# Altium footprint library IC_SMD_QUAD.PCBLIB: 78 footprints (part 4 of 5)
Each footprint in its own frame and in the unit in brackets; x right, y up, seen from the top. Pads: shape width x height; smd on the part's side, far side on the other; paste and mask are expansions set on the pad; w line width, h text height; cw(c..) or ccw(c..) is an arc to the next point about the centre after c.
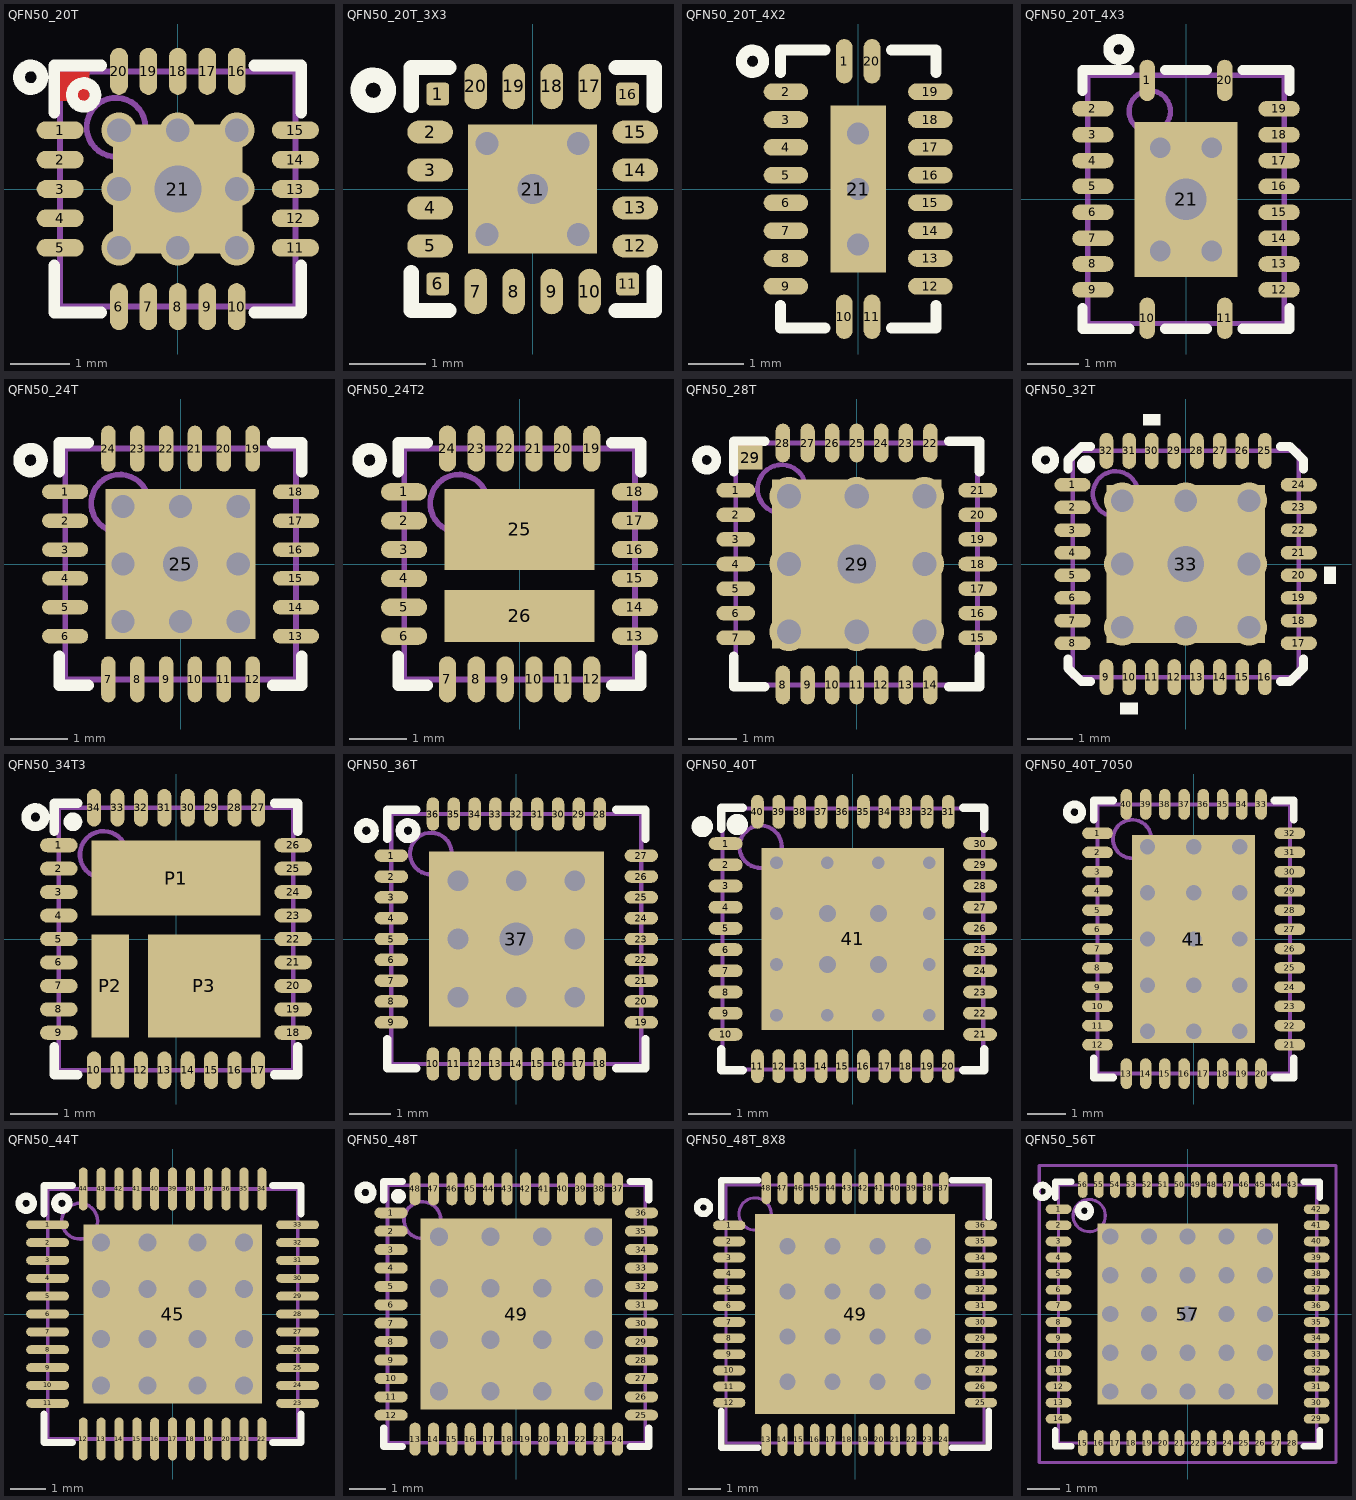
[diagram p3: the footprints below, top view; thin cyan lines are the x and y axes]

## QFN50_20T [mm] "QFN, 20, 4X4mm, 0.5mm"
height 1
pads (21):
  oval 0.8x0.3 smd mask+0.05: 1(-2,1) 2(-2,0.5) 3(-2,0) 4(-2,-0.5) 5(-2,-1) 11(2,-1) 12(2,-0.5) 13(2,0) 14(2,0.5) 15(2,1)
  oval 0.3x0.8 smd mask+0.05: 6(-1,-2) 7(-0.5,-2) 8(0,-2) 9(0.5,-2) 10(1,-2) 16(1,2) 17(0.5,2) 18(0,2) 19(-0.5,2) 20(-1,2)
  rect 2.2x2.2 smd mask+0.1: 21(0,0)
via 0,0 diameter 1.2 hole 0.8
via -1,1 diameter 0.6 hole 0.4
via -1,-1 diameter 0.6 hole 0.4
via 1,-1 diameter 0.6 hole 0.4
via 1,1 diameter 0.6 hole 0.4
via 0,1 diameter 0.6 hole 0.4
via 0,-1 diameter 0.6 hole 0.4
via 1,0 diameter 0.6 hole 0.4
via -1,0 diameter 0.6 hole 0.4
TopLayer:
  rectangle: -2,1.5 -1.5,2
TopOverlay:
  circle w0.2: c-2.5,1.9 r0.2
  circle w0.2: c-1.6,1.6 r0.2
  lines w0.2: -2.1,-1.3 -2.1,-2.1 -1.3,-2.1 ; -2.1,1.3 -2.1,2.1 -1.3,2.1 ; 1.3,-2.1 2.1,-2.1 2.1,-1.3 ; 1.3,2.1 2.1,2.1 2.1,1.3
Mechanical13:
  circle w0.1: c-1.05,1.05 r0.5
  lines w0.1: -2,-2 2,-2 2,2 -2,2 -2,-2
3D body: height 1, standoff 0, extent -2,-2 2,2

## QFN50_20T_3X3 [mm] "QFN20, pitch: 0.5mm, 3x3mm"
height 0.6
pads (21):
  rrect30% 0.3x0.3 smd mask+0.05: 1(-1.25,1.25) 6(-1.25,-1.25) 11(1.25,-1.25) 16(1.25,1.25)
  oval 0.6x0.3 smd mask+0.05: 2(-1.35,0.75) 3(-1.35,0.25) 4(-1.35,-0.25) 5(-1.35,-0.75) 12(1.35,-0.75) 13(1.35,-0.25) 14(1.35,0.25) 15(1.35,0.75)
  oval 0.3x0.6 smd mask+0.05: 7(-0.75,-1.35) 8(-0.25,-1.35) 9(0.25,-1.35) 10(0.75,-1.35) 17(0.75,1.35) 18(0.25,1.35) 19(-0.25,1.35) 20(-0.75,1.35)
  rect 1.7x1.7 smd mask+0.05: 21(0,0)
via -0.6,-0.6 diameter 0.5 hole 0.3
via 0.6,-0.6 diameter 0.5 hole 0.3
via 0.6,0.6 diameter 0.5 hole 0.3
via -0.6,0.6 diameter 0.5 hole 0.3
via 0,0 diameter 0.6 hole 0.4
TopOverlay:
  circle w0.2: c-2.1,1.3 r0.2
  lines w0.2: -1.6,-1.1 -1.6,-1.6 -1.1,-1.6 ; -1.6,1.1 -1.6,1.6 -1.1,1.6 ; 1.1,-1.6 1.6,-1.6 1.6,-1.1 ; 1.1,1.6 1.6,1.6 1.6,1.1
3D body "SW3dPS-QFN-20.STEP": height 0.62, standoff -0.08, extent -1.5,-1.5 1.5,1.5

## QFN50_20T_4X2 [mm] "RGY VQFN-20, 0.5mm Pitch, 4.5x2.5x1mm"
height 1
pads (21):
  oval 0.3x0.8 smd mask+0.075: 1(-0.25,2.3) 10(-0.25,-2.3) 11(0.25,-2.3) 20(0.25,2.3)
  oval 0.8x0.3 smd mask+0.075: 2(-1.3,1.75) 3(-1.3,1.25) 4(-1.3,0.75) 5(-1.3,0.25) 6(-1.3,-0.25) 7(-1.3,-0.75) 8(-1.3,-1.25) 9(-1.3,-1.75) 12(1.3,-1.75) 13(1.3,-1.25) 14(1.3,-0.75) 15(1.3,-0.25) 16(1.3,0.25) 17(1.3,0.75) 18(1.3,1.25) 19(1.3,1.75)
  rect 1x3 smd mask+0.1: 21(0,0)
via 0,1 diameter 0.6 hole 0.4
via 0,0 diameter 0.6 hole 0.4
via 0,-1 diameter 0.6 hole 0.4
TopOverlay:
  circle w0.2: c-1.9,2.3 r0.2
  lines w0.2: -1.4,-2.1 -1.4,-2.5 -0.6,-2.5 ; -1.4,2.1 -1.4,2.5 -0.6,2.5 ; 0.6,-2.5 1.4,-2.5 1.4,-2.1 ; 0.6,2.5 1.4,2.5 1.4,2.1
3D body: height 1, standoff 0, extent -1.3,-2.4 1.3,2.4

## QFN50_20T_4X3 [mm] "RGY VQFN-20, 0.5mm Pitch, 4.5x3.5x1mm"
height 1
pads (21):
  oval 0.3x0.8 smd mask+0.05: 1(-0.75,2.3) 10(-0.75,-2.3) 11(0.75,-2.3) 20(0.75,2.3)
  oval 0.8x0.3 smd mask+0.05: 2(-1.8,1.75) 3(-1.8,1.25) 4(-1.8,0.75) 5(-1.8,0.25) 6(-1.8,-0.25) 7(-1.8,-0.75) 8(-1.8,-1.25) 9(-1.8,-1.75) 12(1.8,-1.75) 13(1.8,-1.25) 14(1.8,-0.75) 15(1.8,-0.25) 16(1.8,0.25) 17(1.8,0.75) 18(1.8,1.25) 19(1.8,1.75)
  rect 2x3 smd mask+0.1: 21(0,0)
via 0.5,1 diameter 0.6 hole 0.4
via 0.5,-1 diameter 0.6 hole 0.4
via -0.5,-1 diameter 0.6 hole 0.4
via -0.5,1 diameter 0.6 hole 0.4
via 0,0 diameter 1.2 hole 0.8
TopOverlay:
  circle w0.2: c-1.3,2.9 r0.2
  lines w0.2: -2,-2.1 -2,-2.5 -1.1,-2.5 ; -2,2.1 -2,2.5 -1.1,2.5 ; -0.4,-2.5 0.4,-2.5 ; -0.4,2.5 0.4,2.5 ; 1.1,-2.5 2,-2.5 2,-2.1 ; 1.1,2.5 2,2.5 2,2.1
Mechanical13:
  circle w0.1: c-0.7,1.7 r0.4
  lines w0.1: -1.9,-2.4 1.9,-2.4 1.9,2.4 -1.9,2.4 -1.9,-2.4
3D body: height 1, standoff 0, extent -1.9,-2.4 1.9,2.4

## QFN50_24T [mm] "RTW, RGE S-PQFP-N24 (TI), HVQFN24, 4X4mm, 0.5mm, MO-220 (JEDEC)"
height 1
pads (25):
  oval 0.8x0.25 smd mask+0.05: 1(-2,1.25) 2(-2,0.75) 3(-2,0.25) 4(-2,-0.25) 5(-2,-0.75) 6(-2,-1.25) 13(2,-1.25) 14(2,-0.75) 15(2,-0.25) 16(2,0.25) 17(2,0.75) 18(2,1.25)
  oval 0.25x0.8 smd mask+0.05: 7(-1.25,-2) 8(-0.75,-2) 9(-0.25,-2) 10(0.25,-2) 11(0.75,-2) 12(1.25,-2) 19(1.25,2) 20(0.75,2) 21(0.25,2) 22(-0.25,2) 23(-0.75,2) 24(-1.25,2)
  rect 2.6x2.6 smd paste-1.2 mask+0.05: 25(0,0)
via 0,0 diameter 0.8 hole 0.6
via -1,1 diameter 0.6 hole 0.4
via -1,-1 diameter 0.6 hole 0.4
via 1,-1 diameter 0.6 hole 0.4
via 1,1 diameter 0.6 hole 0.4
via 0,1 diameter 0.6 hole 0.4
via 0,-1 diameter 0.6 hole 0.4
via 1,0 diameter 0.6 hole 0.4
via -1,0 diameter 0.6 hole 0.4
TopOverlay:
  circle w0.2: c-2.6,1.8 r0.2
  lines w0.2: -2.1,-1.6 -2.1,-2.1 -1.6,-2.1 ; -2.1,1.6 -2.1,2.1 -1.6,2.1 ; 1.6,-2.1 2.1,-2.1 2.1,-1.6 ; 1.6,2.1 2.1,2.1 2.1,1.6
TopPaste:
  region: 0.101,-1.141 0.1,-1.131 0.1,-0.149 0.101,-0.139 0.104,-0.13 0.108,-0.122 0.114,-0.114 0.122,-0.108 0.13,-0.104 0.139,-0.101 0.149,-0.1 1.131,-0.1 1.141,-0.101 1.15,-0.104 1.158,-0.108 1.166,-0.114 1.172,-0.122 1.176,-0.13 1.179,-0.139 1.18,-0.149 1.18,-1.131 1.179,-1.141 1.176,-1.15 1.172,-1.158 1.166,-1.166 1.158,-1.172 1.15,-1.176 1.141,-1.179 1.131,-1.18 0.149,-1.18 0.139,-1.179 0.13,-1.176 0.122,-1.172 0.114,-1.166 0.108,-1.158 0.104,-1.15
  region: -0.101,-0.139 -0.1,-0.149 -0.1,-1.131 -0.101,-1.141 -0.104,-1.15 -0.108,-1.158 -0.114,-1.166 -0.122,-1.172 -0.13,-1.176 -0.139,-1.179 -0.149,-1.18 -1.131,-1.18 -1.141,-1.179 -1.15,-1.176 -1.158,-1.172 -1.166,-1.166 -1.172,-1.158 -1.176,-1.15 -1.179,-1.141 -1.18,-1.131 -1.18,-0.149 -1.179,-0.139 -1.176,-0.13 -1.172,-0.122 -1.166,-0.114 -1.158,-0.108 -1.15,-0.104 -1.141,-0.101 -1.131,-0.1 -0.149,-0.1 -0.139,-0.101 -0.13,-0.104 -0.122,-0.108 -0.114,-0.114 -0.108,-0.122 -0.104,-0.13
  region: -0.101,1.141 -0.1,1.131 -0.1,0.149 -0.101,0.139 -0.104,0.13 -0.108,0.122 -0.114,0.114 -0.122,0.108 -0.13,0.104 -0.139,0.101 -0.149,0.1 -1.131,0.1 -1.141,0.101 -1.15,0.104 -1.158,0.108 -1.166,0.114 -1.172,0.122 -1.176,0.13 -1.179,0.139 -1.18,0.149 -1.18,1.131 -1.179,1.141 -1.176,1.15 -1.172,1.158 -1.166,1.166 -1.158,1.172 -1.15,1.176 -1.141,1.179 -1.131,1.18 -0.149,1.18 -0.139,1.179 -0.13,1.176 -0.122,1.172 -0.114,1.166 -0.108,1.158 -0.104,1.15
  region: 0.101,0.139 0.1,0.149 0.1,1.131 0.101,1.141 0.104,1.15 0.108,1.158 0.114,1.166 0.122,1.172 0.13,1.176 0.139,1.179 0.149,1.18 1.131,1.18 1.141,1.179 1.15,1.176 1.158,1.172 1.166,1.166 1.172,1.158 1.176,1.15 1.179,1.141 1.18,1.131 1.18,0.149 1.179,0.139 1.176,0.13 1.172,0.122 1.166,0.114 1.158,0.108 1.15,0.104 1.141,0.101 1.131,0.1 0.149,0.1 0.139,0.101 0.13,0.104 0.122,0.108 0.114,0.114 0.108,0.122 0.104,0.13
Mechanical13:
  circle w0.1: c-1.05,1.05 r0.5
  lines w0.1: -2,-2 -2,2 2,2 2,-2 -2,-2
3D body "RTW0024H.stp": height 0.8, standoff 0, extent -2,-2 2,2

## QFN50_24T2 [mm] "MO-220-WGGD (JEDEC), LFCSP_WQ, CP - 24 - 12, ADP2386 (AD)"
height 1
pads (26):
  oval 0.8x0.3 smd mask+0.05: 1(-2,1.25) 2(-2,0.75) 3(-2,0.25) 4(-2,-0.25) 5(-2,-0.75) 6(-2,-1.25) 13(2,-1.25) 14(2,-0.75) 15(2,-0.25) 16(2,0.25) 17(2,0.75) 18(2,1.25)
  oval 0.3x0.8 smd mask+0.05: 7(-1.25,-2) 8(-0.75,-2) 9(-0.25,-2) 10(0.25,-2) 11(0.75,-2) 12(1.25,-2) 19(1.25,2) 20(0.75,2) 21(0.25,2) 22(-0.25,2) 23(-0.75,2) 24(-1.25,2)
  rect 2.6x1.4 smd mask+0.05: 25(0,0.6)
  rect 2.6x0.9 smd mask+0.05: 26(0,-0.9)
TopOverlay:
  circle w0.2: c-2.6,1.8 r0.2
  lines w0.2: -2.1,-1.6 -2.1,-2.1 -1.6,-2.1 ; -2.1,1.6 -2.1,2.1 -1.6,2.1 ; 1.6,-2.1 2.1,-2.1 2.1,-1.6 ; 1.6,2.1 2.1,2.1 2.1,1.6
Mechanical13:
  circle w0.1: c-1.05,1.05 r0.5
  lines w0.1: -2,-2 2,-2 2,2 -2,2 -2,-2
3D body: height 1, standoff 0, extent -2,-2 2,2

## QFN50_28T [mm] "QFN, 28, 5X5mm, 0.5mm"
pads (30):
  oval 0.8x0.3 smd mask+0.075: 1(-2.5,1.524) 2(-2.5,1.016) 3(-2.5,0.508) 4(-2.5,0) 5(-2.5,-0.508) 6(-2.5,-1.016) 7(-2.5,-1.524) 15(2.5,-1.524) 16(2.5,-1.016) 17(2.5,-0.508) 18(2.5,0) 19(2.5,0.508) 20(2.5,1.016) 21(2.5,1.524)
  oval 0.3x0.8 smd mask+0.075: 8(-1.524,-2.5) 9(-1.016,-2.5) 10(-0.508,-2.5) 11(0,-2.5) 12(0.508,-2.5) 13(1.016,-2.5) 14(1.524,-2.5) 22(1.524,2.5) 23(1.016,2.5) 24(0.508,2.5) 25(0,2.5) 26(-0.508,2.5) 27(-1.016,2.5) 28(-1.524,2.5)
  rect 0.5x0.5 smd mask+0.075: 29(-2.2,2.2)
  rect 3.5x3.5 smd mask+0.1: 29(0,0)
via -1.4,1.4 diameter 0.8 hole 0.5
via 1.4,1.4 diameter 0.8 hole 0.5
via 1.4,-1.4 diameter 0.8 hole 0.5
via -1.4,-1.4 diameter 0.8 hole 0.5
via 0,-1.4 diameter 0.8 hole 0.5
via -1.4,0 diameter 0.8 hole 0.5
via 0,1.4 diameter 0.8 hole 0.5
via 1.4,0 diameter 0.8 hole 0.5
via 0,0 diameter 1.2 hole 0.8
TopOverlay:
  circle w0.2: c-3.1,2.149 r0.2
  lines w0.2: -2.54,1.905 -2.54,2.54 -1.905,2.54 ; 1.905,2.54 2.54,2.54 2.54,1.905 ; -2.54,-2.54 -2.54,-1.905 -2.54,-2.54 ; -2.54,-2.54 -1.905,-2.54 -2.54,-2.54 ; 2.54,-2.54 2.54,-1.905 2.54,-2.54 ; 2.54,-2.54 1.905,-2.54 2.54,-2.54
Mechanical13:
  circle w0.1: c-1.55,1.55 r0.5
  lines w0.1: -2.5,-2.5 2.5,-2.5 2.5,2.5 -2.5,2.5 -2.5,-2.5
3D body: height 1, standoff 0.01, extent -2.5,-2.5 2.5,2.5

## QFN50_32T [mm] "QFN-32, RGJ, 5X5mm, 0.5mm"
pads (33):
  oval 0.8x0.3 smd mask+0.05: 1(-2.5,1.75) 2(-2.5,1.25) 3(-2.5,0.75) 4(-2.5,0.25) 5(-2.5,-0.25) 6(-2.5,-0.75) 7(-2.5,-1.25) 8(-2.5,-1.75) 17(2.5,-1.75) 18(2.5,-1.25) 19(2.5,-0.75) 20(2.5,-0.25) 21(2.5,0.25) 22(2.5,0.75) 23(2.5,1.25) 24(2.5,1.75)
  oval 0.3x0.8 smd mask+0.05: 9(-1.75,-2.5) 10(-1.25,-2.5) 11(-0.75,-2.5) 12(-0.25,-2.5) 13(0.25,-2.5) 14(0.75,-2.5) 15(1.25,-2.5) 16(1.75,-2.5) 25(1.75,2.5) 26(1.25,2.5) 27(0.75,2.5) 28(0.25,2.5) 29(-0.25,2.5) 30(-0.75,2.5) 31(-1.25,2.5) 32(-1.75,2.5)
  rect 3.5x3.5 smd mask+0.1: 33(0,0)
via 0,0 diameter 1.2 hole 0.8
via 1.4,0 diameter 0.8 hole 0.5
via 0,1.4 diameter 0.8 hole 0.5
via -1.4,0 diameter 0.8 hole 0.5
via 0,-1.4 diameter 0.8 hole 0.5
via -1.4,-1.4 diameter 0.8 hole 0.5
via 1.4,-1.4 diameter 0.8 hole 0.5
via 1.4,1.4 diameter 0.8 hole 0.5
via -1.4,1.4 diameter 0.8 hole 0.5
TopOverlay:
  circle w0.2: c-3.1,2.3 r0.2
  circle w0.2: c-2.2,2.2 r0.1
  region: -1.06,-3.061 -1.441,-3.061 -1.441,-3.315 -1.06,-3.315
  region: 3.061,-0.059 3.315,-0.059 3.315,-0.44 3.061,-0.44
  region: -0.56,3.061 -0.941,3.061 -0.941,3.315 -0.56,3.315
  lines w0.2: -2.6,-2.1 -2.6,-2.3 -2.3,-2.6 -2.1,-2.6 ; -2.6,2.1 -2.6,2.3 -2.3,2.6 -2.1,2.6 ; 2.1,-2.6 2.3,-2.6 2.6,-2.3 2.6,-2.1 ; 2.1,2.6 2.3,2.6 2.6,2.3 2.6,2.1
Mechanical13:
  circle w0.1: c-1.55,1.55 r0.5
  lines w0.1: -2.5,-2.5 -2.5,2.5 2.5,2.5 2.5,-2.5 -2.5,-2.5
3D body: height 1, standoff 0.01, extent -2.5,-2.5 2.5,2.5

## QFN50_34T3 [mm] "TinyBuck (FAIRCHILD), 34-Lead, PQFN, 5.5 mm x 5.0 mm"
height 1.1
pads (37):
  oval 0.8x0.3 smd mask+0.05: 1(-2.5,2) 2(-2.5,1.5) 3(-2.5,1) 4(-2.5,0.5) 5(-2.5,0) 6(-2.5,-0.5) 7(-2.5,-1) 8(-2.5,-1.5) 9(-2.5,-2) 18(2.5,-2) 19(2.5,-1.5) 20(2.5,-1) 21(2.5,-0.5) 22(2.5,0) 23(2.5,0.5) 24(2.5,1) 25(2.5,1.5) 26(2.5,2)
  oval 0.3x0.8 smd mask+0.05: 10(-1.75,-2.8) 11(-1.25,-2.8) 12(-0.75,-2.8) 13(-0.25,-2.8) 14(0.25,-2.8) 15(0.75,-2.8) 16(1.25,-2.8) 17(1.75,-2.8) 27(1.75,2.8) 28(1.25,2.8) 29(0.75,2.8) 30(0.25,2.8) 31(-0.25,2.8) 32(-0.75,2.8) 33(-1.25,2.8) 34(-1.75,2.8)
  rect 3.6x1.6 smd: P1(0,1.3)
  rect 0.8x2.2 smd: P2(-1.4,-1)
  rect 2.4x2.2 smd: P3(0.6,-1)
TopOverlay:
  circle w0.2: c-3,2.6 r0.2
  circle w0.2: c-2.2,2.5 r0.1
  lines w0.2: -2.6,-2.3 -2.6,-2.9 -2.1,-2.9 ; -2.6,2.3 -2.6,2.9 -2.1,2.9 ; 2.1,-2.9 2.6,-2.9 2.6,-2.3 ; 2.1,2.9 2.6,2.9 2.6,2.3
Mechanical13:
  circle w0.1: c-1.55,1.8 r0.5
  lines w0.1: -2.5,-2.8 2.5,-2.8 2.5,2.8 -2.5,2.8 -2.5,-2.8
3D body: height 1.1, standoff 0, extent -2.5,-2.75 2.5,2.8

## QFN50_36T [mm] "MO-220-VJJD (JEDEC), 36 TQFN T3666+3 (MAXIM), 6X6mm, 0.5mm"
height 0.9
pads (37):
  oval 0.8x0.3 smd mask+0.05: 1(-3,2) 2(-3,1.5) 3(-3,1) 4(-3,0.5) 5(-3,0) 6(-3,-0.5) 7(-3,-1) 8(-3,-1.5) 9(-3,-2) 19(3,-2) 20(3,-1.5) 21(3,-1) 22(3,-0.5) 23(3,0) 24(3,0.5) 25(3,1) 26(3,1.5) 27(3,2)
  oval 0.3x0.8 smd mask+0.05: 10(-2,-3) 11(-1.5,-3) 12(-1,-3) 13(-0.5,-3) 14(0,-3) 15(0.5,-3) 16(1,-3) 17(1.5,-3) 18(2,-3) 28(2,3) 29(1.5,3) 30(1,3) 31(0.5,3) 32(0,3) 33(-0.5,3) 34(-1,3) 35(-1.5,3) 36(-2,3)
  rect 4.2x4.2 smd mask+0.1: 37(0,0)
via 0,0 diameter 1.2 hole 0.8
via 1.4,0 diameter 0.8 hole 0.5
via 0,1.4 diameter 0.8 hole 0.5
via -1.4,0 diameter 0.8 hole 0.5
via 0,-1.4 diameter 0.8 hole 0.5
via -1.4,-1.4 diameter 0.8 hole 0.5
via 1.4,-1.4 diameter 0.8 hole 0.5
via 1.4,1.4 diameter 0.8 hole 0.5
via -1.4,1.4 diameter 0.8 hole 0.5
TopOverlay:
  circle w0.2: c-3.6,2.6 r0.2
  circle w0.2: c-2.6,2.6 r0.2
  lines w0.2: -3.1,-2.4 -3.1,-3.1 -2.4,-3.1 ; -3.1,2.4 -3.1,3.1 -2.4,3.1 ; 2.4,-3.1 3.1,-3.1 3.1,-2.4 ; 2.4,3.1 3.1,3.1 3.1,2.4
Mechanical13:
  circle w0.1: c-2.05,2.05 r0.5
  lines w0.1: -3,-3 -3,3 3,3 3,-3 -3,-3
3D body: height 0.9, standoff 0, extent -3,-3 3,3

## QFN50_40T [mm] "PVQFN, QFN, 40-Leads, Body 6x6mm, Pitch 0.5mm"
height 1
pads (41):
  oval 0.8x0.3 smd mask+0.05: 1(-3,2.25) 2(-3,1.75) 3(-3,1.25) 4(-3,0.75) 5(-3,0.25) 6(-3,-0.25) 7(-3,-0.75) 8(-3,-1.25) 9(-3,-1.75) 10(-3,-2.25) 21(3,-2.25) 22(3,-1.75) 23(3,-1.25) 24(3,-0.75) 25(3,-0.25) 26(3,0.25) 27(3,0.75) 28(3,1.25) 29(3,1.75) 30(3,2.25)
  oval 0.3x0.8 smd mask+0.05: 11(-2.25,-3) 12(-1.75,-3) 13(-1.25,-3) 14(-0.75,-3) 15(-0.25,-3) 16(0.25,-3) 17(0.75,-3) 18(1.25,-3) 19(1.75,-3) 20(2.25,-3) 31(2.25,3) 32(1.75,3) 33(1.25,3) 34(0.75,3) 35(0.25,3) 36(-0.25,3) 37(-0.75,3) 38(-1.25,3) 39(-1.75,3) 40(-2.25,3)
  rect 4.3x4.3 smd: 41(0,0)
via 1.8,-1.8 diameter 0.5 hole 0.3
via 0.6,-1.8 diameter 0.5 hole 0.3
via -0.6,-1.8 diameter 0.5 hole 0.3
via -1.8,-1.8 diameter 0.5 hole 0.3
via 1.8,-0.6 diameter 0.5 hole 0.3
via 0.6,-0.6 diameter 0.6 hole 0.4
via -0.6,-0.6 diameter 0.6 hole 0.4
via -1.8,-0.6 diameter 0.5 hole 0.3
via 1.8,0.6 diameter 0.5 hole 0.3
via 0.6,0.6 diameter 0.6 hole 0.4
via -0.6,0.6 diameter 0.6 hole 0.4
via -1.8,0.6 diameter 0.5 hole 0.3
via 1.8,1.8 diameter 0.5 hole 0.3
via 0.6,1.8 diameter 0.5 hole 0.3
via -0.6,1.8 diameter 0.5 hole 0.3
via -1.8,1.8 diameter 0.5 hole 0.3
TopOverlay:
  circle w0.25: c-2.725,2.7 r0.125
  circle w0.25: c-3.55,2.65 r0.125
  lines w0.2: -3.1,-2.6 -3.1,-3.1 -2.6,-3.1 ; -3.1,2.6 -3.1,3.1 -2.6,3.1 ; 2.6,-3.1 3.1,-3.1 3.1,-2.6 ; 2.6,3.1 3.1,3.1 3.1,2.6
Mechanical13:
  circle w0.1: c-2.175,2.175 r0.5
  lines w0.1: -3.075,-3.075 3.075,-3.075 3.075,3.075 -3.075,3.075 -3.075,-3.075
Mechanical15:
  lines w0.1: -0.5,0 0.5,0 ; 0,-0.5 0,0.5
3D body: height 1, standoff 0, extent -3.075,-3.075 3.075,3.075

## QFN50_40T_7050 [mm] "RVF0040, LGFN-CLIP, 7.0X5.0X1.5mm, 0.5mm pitch"
height 1.5
pads (41):
  oval 0.8x0.3 smd mask+0.075: 1(-2.5,2.75) 2(-2.5,2.25) 3(-2.5,1.75) 4(-2.5,1.25) 5(-2.5,0.75) 6(-2.5,0.25) 7(-2.5,-0.25) 8(-2.5,-0.75) 9(-2.5,-1.25) 10(-2.5,-1.75) 11(-2.5,-2.25) 12(-2.5,-2.75) 21(2.5,-2.75) 22(2.5,-2.25) 23(2.5,-1.75) 24(2.5,-1.25) 25(2.5,-0.75) 26(2.5,-0.25) 27(2.5,0.25) 28(2.5,0.75) 29(2.5,1.25) 30(2.5,1.75) 31(2.5,2.25) 32(2.5,2.75)
  oval 0.3x0.8 smd mask+0.075: 13(-1.75,-3.5) 14(-1.25,-3.5) 15(-0.75,-3.5) 16(-0.25,-3.5) 17(0.25,-3.5) 18(0.75,-3.5) 19(1.25,-3.5) 20(1.75,-3.5) 33(1.75,3.5) 34(1.25,3.5) 35(0.75,3.5) 36(0.25,3.5) 37(-0.25,3.5) 38(-0.75,3.5) 39(-1.25,3.5) 40(-1.75,3.5)
  rect 3.2x5.4 smd: 41(0,0)
via 1.2,-2.4 diameter 0.6 hole 0.4
via 0,-2.4 diameter 0.6 hole 0.4
via -1.2,-2.4 diameter 0.6 hole 0.4
via 1.2,-1.2 diameter 0.6 hole 0.4
via 0,-1.2 diameter 0.6 hole 0.4
via -1.2,-1.2 diameter 0.6 hole 0.4
via 1.2,0 diameter 0.6 hole 0.4
via 0,0 diameter 0.6 hole 0.4
via -1.2,0 diameter 0.6 hole 0.4
via 1.2,1.2 diameter 0.6 hole 0.4
via 0,1.2 diameter 0.6 hole 0.4
via -1.2,1.2 diameter 0.6 hole 0.4
via 1.2,2.4 diameter 0.6 hole 0.4
via 0,2.4 diameter 0.6 hole 0.4
via -1.2,2.4 diameter 0.6 hole 0.4
TopOverlay:
  circle w0.2: c-3.1,3.3 r0.2
  lines w0.2: -2.6,-3.1 -2.6,-3.6 -2.1,-3.6 ; -2.6,3.1 -2.6,3.6 -2.1,3.6 ; 2.1,-3.6 2.6,-3.6 2.6,-3.1 ; 2.1,3.6 2.6,3.6 2.6,3.1
Mechanical13:
  circle w0.1: c-1.6,2.6 r0.5
  lines w0.1: -2.5,-3.5 2.5,-3.5 2.5,3.5 -2.5,3.5 -2.5,-3.5
3D body "QFN50_40T_7050.step": height 1.5, standoff 0, extent -2.501,-3.501 2.501,3.501

## QFN50_44T [mm] "QFN-44, 44ML, pitch:0.5mm, 7x7x1mm"
height 1
pads (45):
  oval 1.2x0.25 smd mask+0.05: 1(-3.5,2.5) 2(-3.5,2) 3(-3.5,1.5) 4(-3.5,1) 5(-3.5,0.5) 6(-3.5,0) 7(-3.5,-0.5) 8(-3.5,-1) 9(-3.5,-1.5) 10(-3.5,-2) 11(-3.5,-2.5) 23(3.5,-2.5) 24(3.5,-2) 25(3.5,-1.5) 26(3.5,-1) 27(3.5,-0.5) 28(3.5,0) 29(3.5,0.5) 30(3.5,1) 31(3.5,1.5) 32(3.5,2) 33(3.5,2.5)
  oval 0.25x1.2 smd mask+0.05: 12(-2.5,-3.5) 13(-2,-3.5) 14(-1.5,-3.5) 15(-1,-3.5) 16(-0.5,-3.5) 17(0,-3.5) 18(0.5,-3.5) 19(1,-3.5) 20(1.5,-3.5) 21(2,-3.5) 22(2.5,-3.5) 34(2.5,3.5) 35(2,3.5) 36(1.5,3.5) 37(1,3.5) 38(0.5,3.5) 39(0,3.5) 40(-0.5,3.5) 41(-1,3.5) 42(-1.5,3.5) 43(-2,3.5) 44(-2.5,3.5)
  rect 5x5 smd: 45(0,0)
via -2,2 diameter 0.8 hole 0.5
via -0.7,2 diameter 0.8 hole 0.5
via 0.7,2 diameter 0.8 hole 0.5
via 2,2 diameter 0.8 hole 0.5
via -2,0.7 diameter 0.8 hole 0.5
via -0.7,0.7 diameter 0.8 hole 0.5
via 0.7,0.7 diameter 0.8 hole 0.5
via 2,0.7 diameter 0.8 hole 0.5
via 2,-0.7 diameter 0.8 hole 0.5
via 0.7,-0.7 diameter 0.8 hole 0.5
via -0.7,-0.7 diameter 0.8 hole 0.5
via -2,-0.7 diameter 0.8 hole 0.5
via 2,-2 diameter 0.8 hole 0.5
via 0.7,-2 diameter 0.8 hole 0.5
via -0.7,-2 diameter 0.8 hole 0.5
via -2,-2 diameter 0.8 hole 0.5
TopOverlay:
  circle w0.2: c-4.1,3.1 r0.2
  circle w0.2: c-3.1,3.1 r0.2
  lines w0.2: -3.6,-2.8 -3.6,-3.6 -2.8,-3.6 ; -3.6,2.8 -3.6,3.6 -2.8,3.6 ; 2.8,-3.6 3.6,-3.6 3.6,-2.8 ; 2.8,3.6 3.6,3.6 3.6,2.8
Mechanical13:
  circle w0.1: c-2.6,2.6 r0.5
  lines w0.1: -3.5,-3.5 -3.5,3.5 3.5,3.5 3.5,-3.5 -3.5,-3.5
3D body "QFN50_44T.step": height 1, standoff 0, extent -3.501,-3.501 3.501,3.501

## QFN50_48T [mm] "CP-48 (Analog Device),, MO-220-VKKD-2(JEDEC), RGZ S-PQFP-N48, S-PWQFN-N48(TI), 7X7mm, 0.5mm"
height 1
pads (49):
  oval 0.9x0.3 smd mask+0.05: 1(-3.4,2.75) 2(-3.4,2.25) 3(-3.4,1.75) 4(-3.4,1.25) 5(-3.4,0.75) 6(-3.4,0.25) 7(-3.4,-0.25) 8(-3.4,-0.75) 9(-3.4,-1.25) 10(-3.4,-1.75) 11(-3.4,-2.25) 12(-3.4,-2.75) 25(3.4,-2.75) 26(3.4,-2.25) 27(3.4,-1.75) 28(3.4,-1.25) 29(3.4,-0.75) 30(3.4,-0.25) 31(3.4,0.25) 32(3.4,0.75) 33(3.4,1.25) 34(3.4,1.75) 35(3.4,2.25) 36(3.4,2.75)
  oval 0.3x0.9 smd mask+0.05: 13(-2.75,-3.4) 14(-2.25,-3.4) 15(-1.75,-3.4) 16(-1.25,-3.4) 17(-0.75,-3.4) 18(-0.25,-3.4) 19(0.25,-3.4) 20(0.75,-3.4) 21(1.25,-3.4) 22(1.75,-3.4) 23(2.25,-3.4) 24(2.75,-3.4) 37(2.75,3.4) 38(2.25,3.4) 39(1.75,3.4) 40(1.25,3.4) 41(0.75,3.4) 42(0.25,3.4) 43(-0.25,3.4) 44(-0.75,3.4) 45(-1.25,3.4) 46(-1.75,3.4) 47(-2.25,3.4) 48(-2.75,3.4)
  rect 5.2x5.2 smd mask+0.1: 49(0,0)
via -0.7,0.7 diameter 0.8 hole 0.5
via 2.1,0.7 diameter 0.8 hole 0.5
via 2.1,-2.1 diameter 0.8 hole 0.5
via -0.7,-2.1 diameter 0.8 hole 0.5
via 0.7,-2.1 diameter 0.8 hole 0.5
via -0.7,-0.7 diameter 0.8 hole 0.5
via 0.7,0.7 diameter 0.8 hole 0.5
via 2.1,-0.7 diameter 0.8 hole 0.5
via 0.7,-0.7 diameter 0.8 hole 0.5
via 0.7,2.1 diameter 0.8 hole 0.5
via 2.1,2.1 diameter 0.8 hole 0.5
via -0.7,2.1 diameter 0.8 hole 0.5
via -2.1,2.1 diameter 0.8 hole 0.5
via -2.1,-0.7 diameter 0.8 hole 0.5
via -2.1,-2.1 diameter 0.8 hole 0.5
via -2.1,0.7 diameter 0.8 hole 0.5
TopOverlay:
  circle w0.2: c-3.2,3.2 r0.1
  circle w0.2: c-4.1,3.3 r0.2
  lines w0.2: -3.6,-3.1 -3.6,-3.6 -3.1,-3.6 ; -3.6,3.1 -3.6,3.6 -3.1,3.6 ; 3.1,-3.6 3.6,-3.6 3.6,-3.1 ; 3.1,3.6 3.6,3.6 3.6,3.1
Mechanical13:
  circle w0.1: c-2.55,2.55 r0.5
  lines w0.1: -3.5,-3.5 -3.5,3.5 3.5,3.5 3.5,-3.5 -3.5,-3.5
3D body "RTC0048A.stp": height 0.85, standoff 0, extent -3.5,-3.5 3.5,3.5

## QFN50_48T_8X8 [mm] "QFN-48 pitch:0.5mm, 8X8mm, FT232HQ"
height 1
pads (49):
  oval 1x0.3 smd mask+0.05: 1(-3.9,2.75) 2(-3.9,2.25) 3(-3.9,1.75) 4(-3.9,1.25) 5(-3.9,0.75) 6(-3.9,0.25) 7(-3.9,-0.25) 8(-3.9,-0.75) 9(-3.9,-1.25) 10(-3.9,-1.75) 11(-3.9,-2.25) 12(-3.9,-2.75) 25(3.9,-2.75) 26(3.9,-2.25) 27(3.9,-1.75) 28(3.9,-1.25) 29(3.9,-0.75) 30(3.9,-0.25) 31(3.9,0.25) 32(3.9,0.75) 33(3.9,1.25) 34(3.9,1.75) 35(3.9,2.25) 36(3.9,2.75)
  oval 0.3x1 smd mask+0.05: 13(-2.75,-3.9) 14(-2.25,-3.9) 15(-1.75,-3.9) 16(-1.25,-3.9) 17(-0.75,-3.9) 18(-0.25,-3.9) 19(0.25,-3.9) 20(0.75,-3.9) 21(1.25,-3.9) 22(1.75,-3.9) 23(2.25,-3.9) 24(2.75,-3.9) 37(2.75,3.9) 38(2.25,3.9) 39(1.75,3.9) 40(1.25,3.9) 41(0.75,3.9) 42(0.25,3.9) 43(-0.25,3.9) 44(-0.75,3.9) 45(-1.25,3.9) 46(-1.75,3.9) 47(-2.25,3.9) 48(-2.75,3.9)
  rect 6.2x6.2 smd: 49(0,0)
via -2.1,0.7 diameter 0.8 hole 0.5
via -2.1,-2.1 diameter 0.8 hole 0.5
via -2.1,-0.7 diameter 0.8 hole 0.5
via -2.1,2.1 diameter 0.8 hole 0.5
via -0.7,2.1 diameter 0.8 hole 0.5
via 2.1,2.1 diameter 0.8 hole 0.5
via 0.7,2.1 diameter 0.8 hole 0.5
via 0.7,-0.7 diameter 0.8 hole 0.5
via 2.1,-0.7 diameter 0.8 hole 0.5
via 0.7,0.7 diameter 0.8 hole 0.5
via -0.7,-0.7 diameter 0.8 hole 0.5
via 0.7,-2.1 diameter 0.8 hole 0.5
via -0.7,-2.1 diameter 0.8 hole 0.5
via 2.1,-2.1 diameter 0.8 hole 0.5
via 2.1,0.7 diameter 0.8 hole 0.5
via -0.7,0.7 diameter 0.8 hole 0.5
TopOverlay:
  circle w0.2: c-4.7,3.3 r0.2
  lines w0.2: -4.15,-3 -4.15,-4.15 -3,-4.15 ; -4.15,3 -4.15,4.15 -3,4.15 ; 3,-4.15 4.15,-4.15 4.15,-3 ; 3,4.15 4.15,4.15 4.15,3
Mechanical13:
  circle w0.1: c-3.1,3.1 r0.5
  lines w0.1: -4,-4 -4,4 4,4 4,-4 -4,-4
3D body "QFN50_48T_8X8.step": height 1, standoff 0, extent -4.001,-4.001 4.001,4.001

## QFN50_56T [mm] "QFN56, pitch: 0.5mm, 8x8mm"
height 1
pads (57):
  oval 0.8x0.3 smd mask+0.05: 1(-4,3.25) 2(-4,2.75) 3(-4,2.25) 4(-4,1.75) 5(-4,1.25) 6(-4,0.75) 7(-4,0.25) 8(-4,-0.25) 9(-4,-0.75) 10(-4,-1.25) 11(-4,-1.75) 12(-4,-2.25) 13(-4,-2.75) 14(-4,-3.25) 29(4,-3.25) 30(4,-2.75) 31(4,-2.25) 32(4,-1.75) 33(4,-1.25) 34(4,-0.75) 35(4,-0.25) 36(4,0.25) 37(4,0.75) 38(4,1.25) 39(4,1.75) 40(4,2.25) 41(4,2.75) 42(4,3.25)
  oval 0.3x0.8 smd mask+0.05: 15(-3.25,-4) 16(-2.75,-4) 17(-2.25,-4) 18(-1.75,-4) 19(-1.25,-4) 20(-0.75,-4) 21(-0.25,-4) 22(0.25,-4) 23(0.75,-4) 24(1.25,-4) 25(1.75,-4) 26(2.25,-4) 27(2.75,-4) 28(3.25,-4) 43(3.25,4) 44(2.75,4) 45(2.25,4) 46(1.75,4) 47(1.25,4) 48(0.75,4) 49(0.25,4) 50(-0.25,4) 51(-0.75,4) 52(-1.25,4) 53(-1.75,4) 54(-2.25,4) 55(-2.75,4) 56(-3.25,4)
  rect 5.6x5.6 smd mask+0.1: 57(0,0)
via 0,0 diameter 0.8 hole 0.5
via 0,2.4 diameter 0.8 hole 0.5
via 0,1.2 diameter 0.8 hole 0.5
via -1.2,0 diameter 0.8 hole 0.5
via -2.4,0 diameter 0.8 hole 0.5
via 0,-1.2 diameter 0.8 hole 0.5
via 0,-2.4 diameter 0.8 hole 0.5
via -1.2,-1.2 diameter 0.8 hole 0.5
via -1.2,-2.4 diameter 0.8 hole 0.5
via -2.4,-1.2 diameter 0.8 hole 0.5
via -2.4,-2.4 diameter 0.8 hole 0.5
via -1.2,1.2 diameter 0.8 hole 0.5
via -1.2,2.4 diameter 0.8 hole 0.5
via -2.4,1.2 diameter 0.8 hole 0.5
via -2.4,2.4 diameter 0.8 hole 0.5
via 2.4,2.4 diameter 0.8 hole 0.5
via 2.4,1.2 diameter 0.8 hole 0.5
via 1.2,2.4 diameter 0.8 hole 0.5
via 1.2,1.2 diameter 0.8 hole 0.5
via 2.4,-2.4 diameter 0.8 hole 0.5
via 2.4,-1.2 diameter 0.8 hole 0.5
via 1.2,-2.4 diameter 0.8 hole 0.5
via 1.2,-1.2 diameter 0.8 hole 0.5
via 2.4,0 diameter 0.8 hole 0.5
via 1.2,0 diameter 0.8 hole 0.5
TopOverlay:
  circle w0.2: c-3.2,3.2 r0.2
  circle w0.2: c-4.5,3.8 r0.2
  lines w0.2: -4.1,-3.6 -4.1,-4.1 -3.6,-4.1 ; -4.1,3.6 -4.1,4.1 -3.6,4.1 ; 3.6,-4.1 4.1,-4.1 4.1,-3.6 ; 3.6,4.1 4.1,4.1 4.1,3.6
TopSolder:
  drawing of 25 lines, arcs and shapes, not listed
Mechanical13:
  circle w0.1: c-3.05,3.05 r0.5
  lines w0.1: -4,-4 4,-4 4,4 -4,4 -4,-4
Mechanical15:
  lines w0.1: -0.5,0 0.5,0 ; 0,-0.5 0,0.5 ; -4.6,-4.6 4.6,-4.6 4.6,4.6 -4.6,4.6 -4.6,-4.6
3D body "User Library-QFN56 (8x8).step": height 0.95, standoff 0, extent -4.015,-4.015 4.015,4.015